# Altium schematic symbol library LTSpiceLibrary.SchLib: 776 symbols (part 2 of 3)
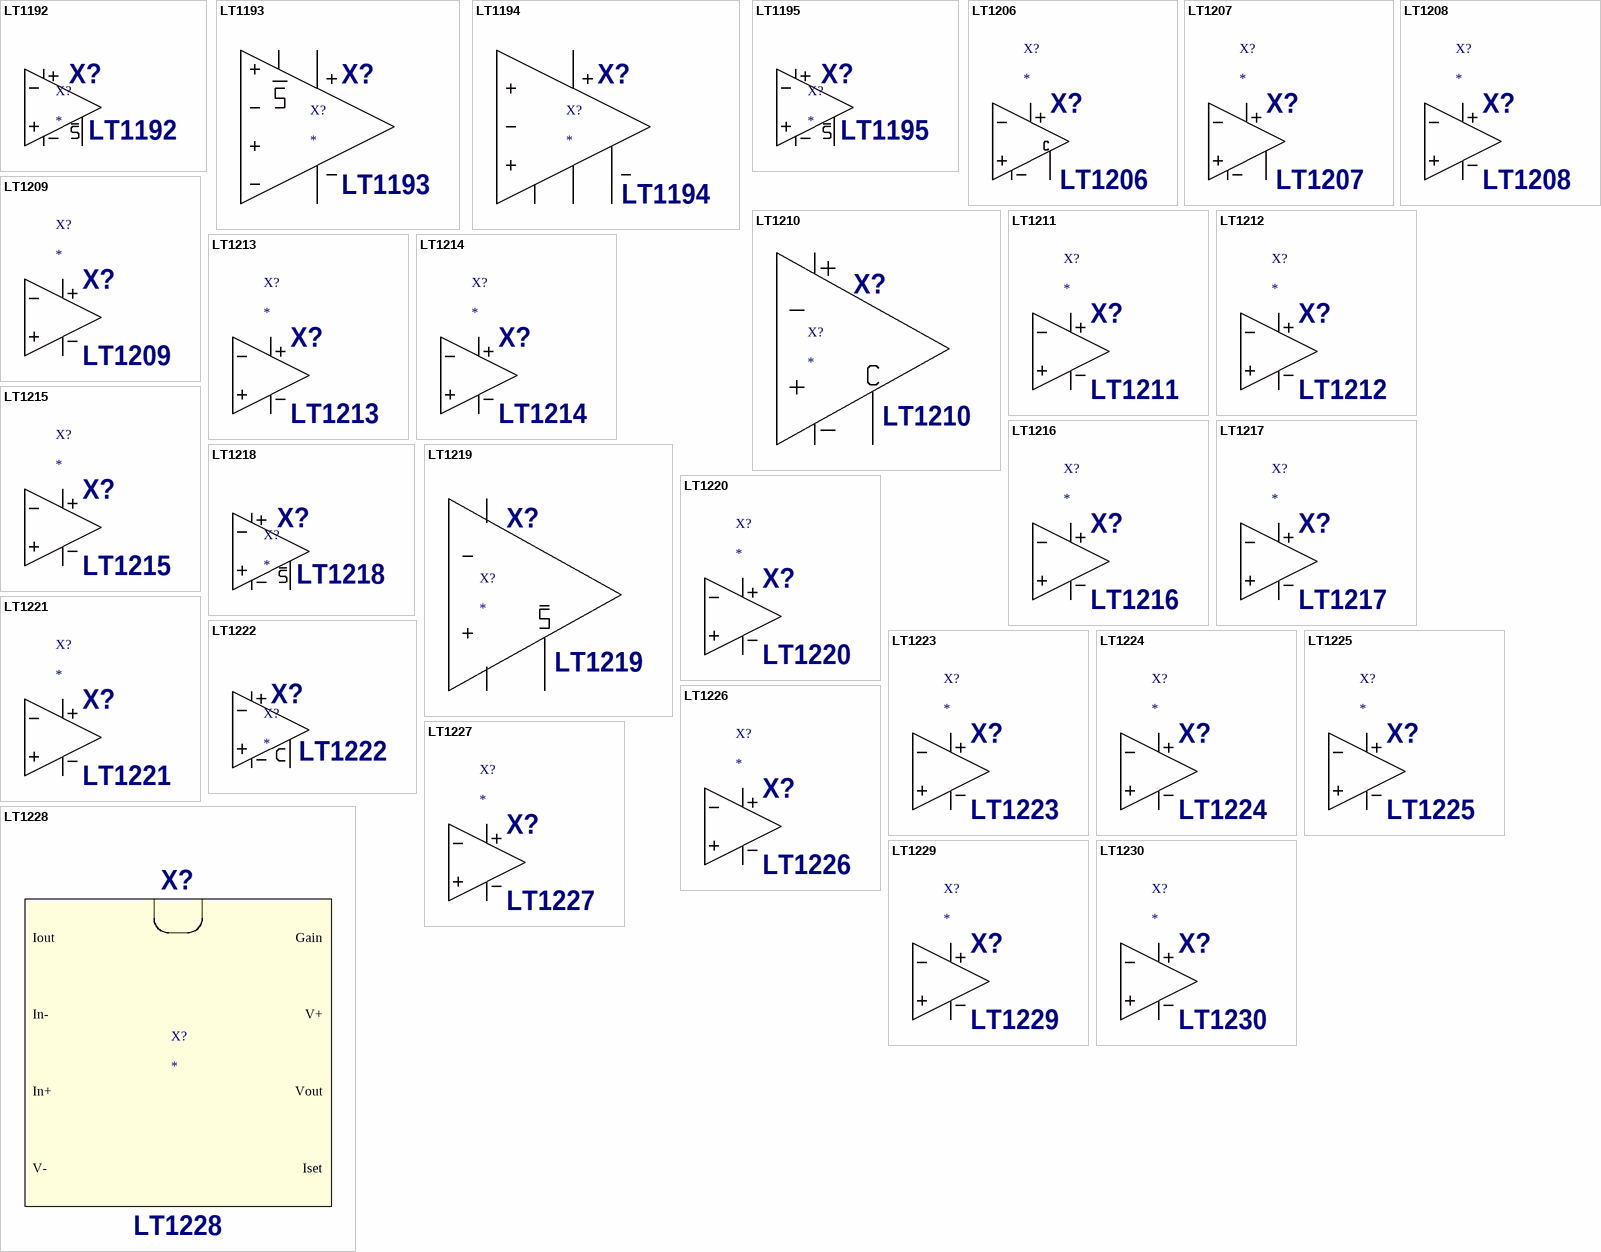
[diagram p29: symbols LT1192 to LT1230]

## LT1193
designator X?  value LT1193  InstName: X?
Prefix: X; Description: Video Difference Amplifier, Adjustable Gain; SpiceModel: LTC.lib; Value2: LT1193
pins: 1 In+, 2 In-, 3 V+, 4 V-, 5 OUT, 6 REF, 7 FB, 8 _SHDN

## LT1194
designator X?  value LT1194  InstName: X?
Prefix: X; Description: Video Difference Amplifier, Gain of 10; SpiceModel: LTC.lib; Value2: LT1194
pins: 1 In+, 2 In-, 3 V+, 4 V-, 5 OUT, 6 REF, 7 VOS1, 8 VOS2

## LT1195
designator X?  value LT1195  InstName: X?
Prefix: X; Description: Low Power, Ultra High Speed Operational Amplifier; SpiceModel: LTC.lib; Value2: LT1195
pins: 1 In+, 2 In-, 3 V+, 4 V-, 5 OUT, 6 SHDN

## LT1206
designator X?  value LT1206  InstName: X?
Prefix: X; Description: 250mA/60MHz Current Feedback Amplifier; SpiceModel: LTC.lib; Value2: LT1206
pins: 1 In+, 2 In-, 3 V+, 4 V-, 5 OUT, 6 COMP

## LT1207
designator X?  value LT1207  InstName: X?
Prefix: X; Value2: LT1206; Description: Dual 250mA/60MHz Current Feedback Amplifier; SpiceModel: LTC.lib
pins: 1 In+, 2 In-, 3 V+, 4 V-, 5 OUT, 6 COMP

## LT1208
designator X?  value LT1208  InstName: X?
Prefix: X; Description: Dual 45MHz, 400V/�s Operational Amplifier; SpiceModel: LTC.lib; Value2: LT1208
pins: 1 In+, 2 In-, 3 V+, 4 V-, 5 OUT

## LT1209
designator X?  value LT1209  InstName: X?
Prefix: X; Value2: LT1208; Description: Quad 45MHz, 400V/�s Operational Amplifier; SpiceModel: LTC.lib
pins: 1 In+, 2 In-, 3 V+, 4 V-, 5 OUT

## LT1210
designator X?  value LT1210  InstName: X?
Prefix: X; Description: 1.1A, 35MHz Current Feedback Amplifier; SpiceModel: LTC.lib; Value2: LT1210
pins: 1 In+, 2 In-, 3 V+, 4 V-, 5 OUT, 6 CMP

## LT1211
designator X?  value LT1211  InstName: X?
Prefix: X; Description: 14MHz, 7V/�s, Single Supply Dual Precision Operational Amplifier; SpiceModel: LTC.lib; Value2: LT1211
pins: 1 In+, 2 In-, 3 V+, 4 V-, 5 OUT

## LT1212
designator X?  value LT1212  InstName: X?
Prefix: X; Value2: LT1211; Description: 14MHz, 7V/�s, Single Supply Quad Precision Operational Amplifier; SpiceModel: LTC.lib
pins: 1 In+, 2 In-, 3 V+, 4 V-, 5 OUT

## LT1213
designator X?  value LT1213  InstName: X?
Prefix: X; Description: 28MHz, 12V/�s, Single Supply Dual Precision Operational Amplifier; SpiceModel: LTC.lib; Value2: LT1213
pins: 1 In+, 2 In-, 3 V+, 4 V-, 5 OUT

## LT1214
designator X?  value LT1214  InstName: X?
Prefix: X; Value2: LT1213; Description: 28MHz, 12V/�s, Single Supply Quad Precision Operational Amplifier; SpiceModel: LTC.lib
pins: 1 In+, 2 In-, 3 V+, 4 V-, 5 OUT

## LT1215
designator X?  value LT1215  InstName: X?
Prefix: X; Description: 23MHz, 50V/�s, Single Supply Dual Precision Operational Amplifier; SpiceModel: LTC.lib; Value2: LT1215
pins: 1 In+, 2 In-, 3 V+, 4 V-, 5 OUT

## LT1216
designator X?  value LT1216  InstName: X?
Prefix: X; Value2: LT1215; Description: 23MHz, 50V/�s, Single Supply Quad Precision Operational Amplifier; SpiceModel: LTC.lib
pins: 1 In+, 2 In-, 3 V+, 4 V-, 5 OUT

## LT1217
designator X?  value LT1217  InstName: X?
Prefix: X; Description: Low Power High Speed Current Feedback Amplifier; SpiceModel: LTC.lib; Value2: LT1217
pins: 1 In+, 2 In-, 3 V+, 4 V-, 5 OUT

## LT1218
designator X?  value LT1218  InstName: X?
Prefix: X; Description: Precision Rail-to-Rail Input and Output Op Amp; SpiceModel: LTC.lib; Value2: LT1218
pins: 1 In+, 2 In-, 3 V+, 4 V-, 5 OUT, 6 SHDN

## LT1219
designator X?  value LT1219  InstName: X?
Prefix: X; Description: Precision Rail-to-Rail Input and Output Operational Amplifier; SpiceModel: LTC.lib; Value2: LT1219
pins: 1 In+, 2 In-, 3 V+, 4 V-, 5 OUT, 6 SHDN

## LT1220
designator X?  value LT1220  InstName: X?
Prefix: X; Description: Very High Speed Operational Amplifier(Av >= 1); SpiceModel: LTC.lib; Value2: LT1220
pins: 1 In+, 2 In-, 3 V+, 4 V-, 5 OUT

## LT1221
designator X?  value LT1221  InstName: X?
Prefix: X; Description: Very High Speed Operational Amplifier(Av >= 4); SpiceModel: LTC.lib; Value2: LT1221
pins: 1 In+, 2 In-, 3 V+, 4 V-, 5 OUT

## LT1222
designator X?  value LT1222  InstName: X?
Prefix: X; Description: Low Noise, Very High Speed Operational Amplifier(Av >= 10); SpiceModel: LTC.lib; Value2: LT1222
pins: 1 In+, 2 In-, 3 V+, 4 V-, 5 OUT, 6 Comp

## LT1223
designator X?  value LT1223  InstName: X?
Prefix: X; Description: 100MHz Current Feedback Amplifier; SpiceModel: LTC.lib; Value2: LT1223
pins: 1 In+, 2 In-, 3 V+, 4 V-, 5 OUT

## LT1224
designator X?  value LT1224  InstName: X?
Prefix: X; Description: Very High Speed Operational Amplifier(Av >= 1); SpiceModel: LTC.lib; Value2: LT1224
pins: 1 In+, 2 In-, 3 V+, 4 V-, 5 OUT

## LT1225
designator X?  value LT1225  InstName: X?
Prefix: X; Description: Very High Speed Operational Amplifier(Av >= 5); SpiceModel: LTC.lib; Value2: LT1225
pins: 1 In+, 2 In-, 3 V+, 4 V-, 5 OUT

## LT1226
designator X?  value LT1226  InstName: X?
Prefix: X; Description: Very High Speed Operational Amplifier(Av >= 25); SpiceModel: LTC.lib; Value2: LT1226
pins: 1 In+, 2 In-, 3 V+, 4 V-, 5 OUT

## LT1227
designator X?  value LT1227  InstName: X?
Prefix: X; Description: 140MHz Video Current Feedback Amplifier; SpiceModel: LTC.lib; Value2: LT1227
pins: 1 In+, 2 In-, 3 V+, 4 V-, 5 OUT

## LT1228
designator X?  value LT1228  InstName: X?
Prefix: X; Description: 100MHz Current Feedback Amplifier with DC Gain Control; SpiceModel: LTC.lib; Value2: LT1228
pins: 1 Iout, 2 In-, 3 In+, 4 V-, 5 Iset, 6 Vout, 7 V+, 8 Gain

## LT1229
designator X?  value LT1229  InstName: X?
Prefix: X; Description: Dual 100MHz Current Feedback Amplifier; SpiceModel: LTC.lib; Value2: LT1229
pins: 1 In+, 2 In-, 3 V+, 4 V-, 5 OUT

## LT1230
designator X?  value LT1230  InstName: X?
Prefix: X; Value2: LT1229; Description: Quad 100MHz Current Feedback Amplifier; SpiceModel: LTC.lib
pins: 1 In+, 2 In-, 3 V+, 4 V-, 5 OUT

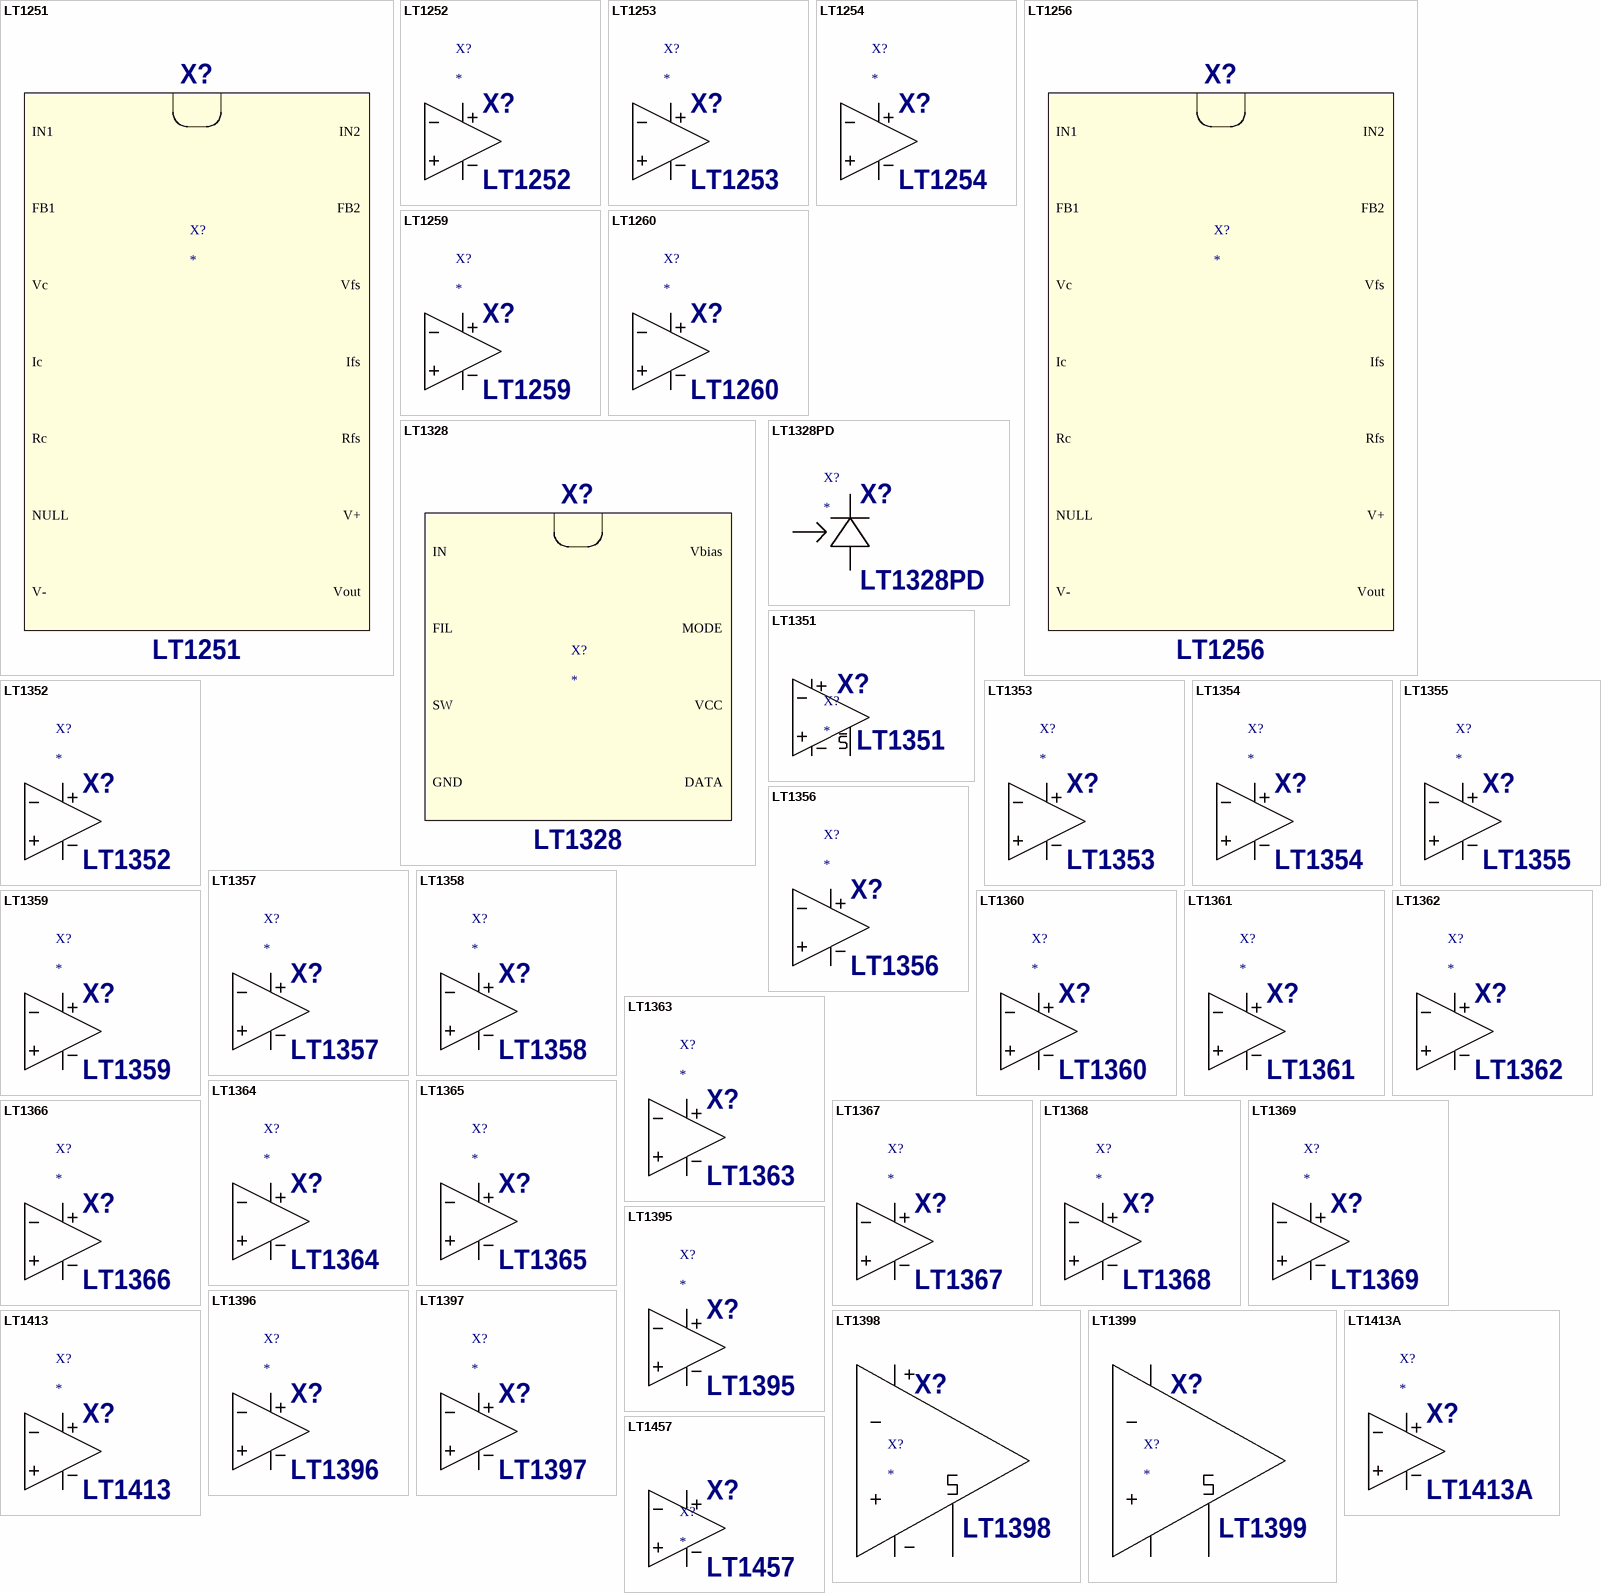
[diagram p9: symbols LT1251 to LT1457]

## LT1251
designator X?  value LT1251  InstName: X?
Prefix: X; Description: 40MHz Video Fader and DC Gain Controlled Amplifier; SpiceModel: LTC.lib; Value2: LT1251
pins: 1 IN1, 2 FB1, 3 Vc, 4 Ic, 5 Rc, 6 NULL, 7 V-, 8 Vout, 9 V+, 10 Rfs, 11 Ifs, 12 Vfs, 13 FB2, 14 IN2

## LT1252
designator X?  value LT1252  InstName: X?
Prefix: X; Description: Low Cost Video Amplifier; SpiceModel: LTC.lib; Value2: LT1252
pins: 1 In+, 2 In-, 3 V+, 4 V-, 5 OUT

## LT1253
designator X?  value LT1253  InstName: X?
Prefix: X; Description: Dual Low Cost Video Amplifier; SpiceModel: LTC.lib; Value2: LT1253
pins: 1 In+, 2 In-, 3 V+, 4 V-, 5 OUT

## LT1254
designator X?  value LT1254  InstName: X?
Prefix: X; Description: Quad Low Cost Video Amplifier; SpiceModel: LTC.lib; Value2: LT1254
pins: 1 In+, 2 In-, 3 V+, 4 V-, 5 OUT

## LT1256
designator X?  value LT1256  InstName: X?
Prefix: X; Description: 40MHz Video Fader and DC Gain Controlled Amplifier; SpiceModel: LTC.lib; Value2: LT1256
pins: 1 IN1, 2 FB1, 3 Vc, 4 Ic, 5 Rc, 6 NULL, 7 V-, 8 Vout, 9 V+, 10 Rfs, 11 Ifs, 12 Vfs, 13 FB2, 14 IN2

## LT1259
designator X?  value LT1259  InstName: X?
Prefix: X; Description: Low Cost Dual 130MHz Current Feedback Amplifier with Shutdown; SpiceModel: LTC.lib; Value2: LT1259
pins: 1 In+, 2 In-, 3 V+, 4 V-, 5 OUT

## LT1260
designator X?  value LT1260  InstName: X?
Prefix: X; Value2: LT1259; Description: Low Cost Triple 130MHz Current Feedback Amplifier with Shutdown; SpiceModel: LTC.lib
pins: 1 In+, 2 In-, 3 V+, 4 V-, 5 OUT

## LT1328
designator X?  value LT1328  InstName: X?
Prefix: X; Description: 4Mbps IrDA Infrared Receiver -- simulate with LT1328PD, the IR diode; SpiceModel: LTC.lib; Value2: LT1328
pins: 1 IN, 2 FIL, 3 SW, 4 GND, 5 DATA, 6 VCC, 7 MODE, 8 Vbias

## LT1328PD
designator X?  value LT1328PD  InstName: X?
Prefix: X; Description: A photodiode similar to a SFH-205 for testing the LT1328, drive the light input with a current source; SpiceModel: LTC.lib; Value2: LT1328PD
pins: 1 A, 2 C, 3 L

## LT1351
designator X?  value LT1351  InstName: X?
Prefix: X; Description: 250�A, 3MHz, 200V/�s, Operational Amplifier; SpiceModel: LTC.lib; Value2: LT1351
pins: 1 In+, 2 In-, 3 V+, 4 V-, 5 OUT, 6 SHDN

## LT1352
designator X?  value LT1352  InstName: X?
Prefix: X; Description: Dual 250mA, 3MHz, 200V/�s, Operational Amplifier; SpiceModel: LTC.lib; Value2: LT1352
pins: 1 In+, 2 In-, 3 V+, 4 V-, 5 OUT

## LT1353
designator X?  value LT1353  InstName: X?
Prefix: X; Value2: LT1352; Description: Quad 250mA, 3MHz, 200V/�s, Operational Amplifier; SpiceModel: LTC.lib
pins: 1 In+, 2 In-, 3 V+, 4 V-, 5 OUT

## LT1354
designator X?  value LT1354  InstName: X?
Prefix: X; Description: 12MHz, 400V/�s, Operational Amplifier; SpiceModel: LTC.lib; Value2: LT1354
pins: 1 In+, 2 In-, 3 V+, 4 V-, 5 OUT

## LT1355
designator X?  value LT1355  InstName: X?
Prefix: X; Value2: LT1354; Description: Dual 12MHz, 400V/�s, Operational Amplifier; SpiceModel: LTC.lib
pins: 1 In+, 2 In-, 3 V+, 4 V-, 5 OUT

## LT1356
designator X?  value LT1356  InstName: X?
Prefix: X; Value2: LT1354; Description: Quad 12MHz, 400V/�s, Operational Amplifier; SpiceModel: LTC.lib
pins: 1 In+, 2 In-, 3 V+, 4 V-, 5 OUT

## LT1357
designator X?  value LT1357  InstName: X?
Prefix: X; Description: 25MHz, 600V/�s, Operational Amplifier; SpiceModel: LTC.lib; Value2: LT1357
pins: 1 In+, 2 In-, 3 V+, 4 V-, 5 OUT

## LT1358
designator X?  value LT1358  InstName: X?
Prefix: X; Value2: LT1357; Description: Dual 25MHz, 600V/�s, Operational Amplifier; SpiceModel: LTC.lib
pins: 1 In+, 2 In-, 3 V+, 4 V-, 5 OUT

## LT1359
designator X?  value LT1359  InstName: X?
Prefix: X; Value2: LT1357; Description: Quad 25MHz, 600V/�s, Operational Amplifier; SpiceModel: LTC.lib
pins: 1 In+, 2 In-, 3 V+, 4 V-, 5 OUT

## LT1360
designator X?  value LT1360  InstName: X?
Prefix: X; Description: 50MHz, 800V/�s, Operational Amplifier; SpiceModel: LTC.lib; Value2: LT1360
pins: 1 In+, 2 In-, 3 V+, 4 V-, 5 OUT

## LT1361
designator X?  value LT1361  InstName: X?
Prefix: X; Value2: LT1360; Description: Dual 50MHz, 800V/�s, Operational Amplifier; SpiceModel: LTC.lib
pins: 1 In+, 2 In-, 3 V+, 4 V-, 5 OUT

## LT1362
designator X?  value LT1362  InstName: X?
Prefix: X; Value2: LT1360; Description: Quad 50MHz, 800V/�s, Operational Amplifier; SpiceModel: LTC.lib
pins: 1 In+, 2 In-, 3 V+, 4 V-, 5 OUT

## LT1363
designator X?  value LT1363  InstName: X?
Prefix: X; Description: 70MHz, 1000V/�s, Operational Amplifier; SpiceModel: LTC.lib; Value2: LT1363
pins: 1 In+, 2 In-, 3 V+, 4 V-, 5 OUT

## LT1364
designator X?  value LT1364  InstName: X?
Prefix: X; Value2: LT1363; Description: Dual 70MHz, 1000V/�s, Operational Amplifier; SpiceModel: LTC.lib
pins: 1 In+, 2 In-, 3 V+, 4 V-, 5 OUT

## LT1365
designator X?  value LT1365  InstName: X?
Prefix: X; Value2: LT1363; Description: Quad 70MHz, 1000V/�s, Operational Amplifier; SpiceModel: LTC.lib
pins: 1 In+, 2 In-, 3 V+, 4 V-, 5 OUT

## LT1366
designator X?  value LT1366  InstName: X?
Prefix: X; Description: Dual Precision Rail-to-Rail Input and Output Operational Amplifier; SpiceModel: LTC.lib; Value2: LT1366
pins: 1 In+, 2 In-, 3 V+, 4 V-, 5 OUT

## LT1367
designator X?  value LT1367  InstName: X?
Prefix: X; Value2: LT1366; Description: Quad Precision Rail-to-Rail Input and Output Operational Amplifier; SpiceModel: LTC.lib
pins: 1 In+, 2 In-, 3 V+, 4 V-, 5 OUT

## LT1368
designator X?  value LT1368  InstName: X?
Prefix: X; Description: Dual Precision Rail-to-Rail Input and Output Operational Amplifier; SpiceModel: LTC.lib; Value2: LT1368
pins: 1 In+, 2 In-, 3 V+, 4 V-, 5 OUT

## LT1369
designator X?  value LT1369  InstName: X?
Prefix: X; Value2: LT1368; Description: Quad Precision Rail-to-Rail Input and Output Operational Amplifier; SpiceModel: LTC.lib
pins: 1 In+, 2 In-, 3 V+, 4 V-, 5 OUT

## LT1395
designator X?  value LT1395  InstName: X?
Prefix: X; Description: 400MHz Current Feedback Amplifier; SpiceModel: LTC.lib; Value2: LT1395
pins: 1 In+, 2 In-, 3 V+, 4 V-, 5 OUT

## LT1396
designator X?  value LT1396  InstName: X?
Prefix: X; Value2: LT1395; Description: Dual 400MHz Current Feedback Amplifier; SpiceModel: LTC.lib
pins: 1 In+, 2 In-, 3 V+, 4 V-, 5 OUT

## LT1397
designator X?  value LT1397  InstName: X?
Prefix: X; Value2: LT1395; Description: Quad 400MHz Current Feedback Amplifier; SpiceModel: LTC.lib
pins: 1 In+, 2 In-, 3 V+, 4 V-, 5 OUT

## LT1398
designator X?  value LT1398  InstName: X?
Prefix: X; Description: Dual Low Cost 300MHz Current Feedback Amplifier with Shutdown; SpiceModel: LTC.lib; Value2: LT1398
pins: 1 In+, 2 In-, 3 V+, 4 V-, 5 OUT, 6 SHDN

## LT1399
designator X?  value LT1399  InstName: X?
Prefix: X; Value2: LT1398; Description: Triple Low Cost 300MHz Current Feedback Amplifier with Shutdown; SpiceModel: LTC.lib
pins: 1 In+, 2 In-, 3 V+, 4 V-, 5 OUT, 6 SHDN

## LT1413
designator X?  value LT1413  InstName: X?
Prefix: X; Description: Single Supply, Dual Precision Operational Amplifier; SpiceModel: LTC.lib; Value2: LT1413
pins: 1 In+, 2 In-, 3 V+, 4 V-, 5 OUT

## LT1413A
designator X?  value LT1413A  InstName: X?
Prefix: X; Value2: LT1413; Description: Single Supply, Dual Precision Operational Amplifier; SpiceModel: LTC.lib
pins: 1 In+, 2 In-, 3 V+, 4 V-, 5 OUT

## LT1457
designator X?  value LT1457  InstName: X?
Prefix: X; Description: Dual Precision JFET Op Amp; SpiceModel: LTC2.LIB; Value2: LT1457
pins: 1 IN+, 2 IN-, 3 OUT, 4 VCC, 5 VEE

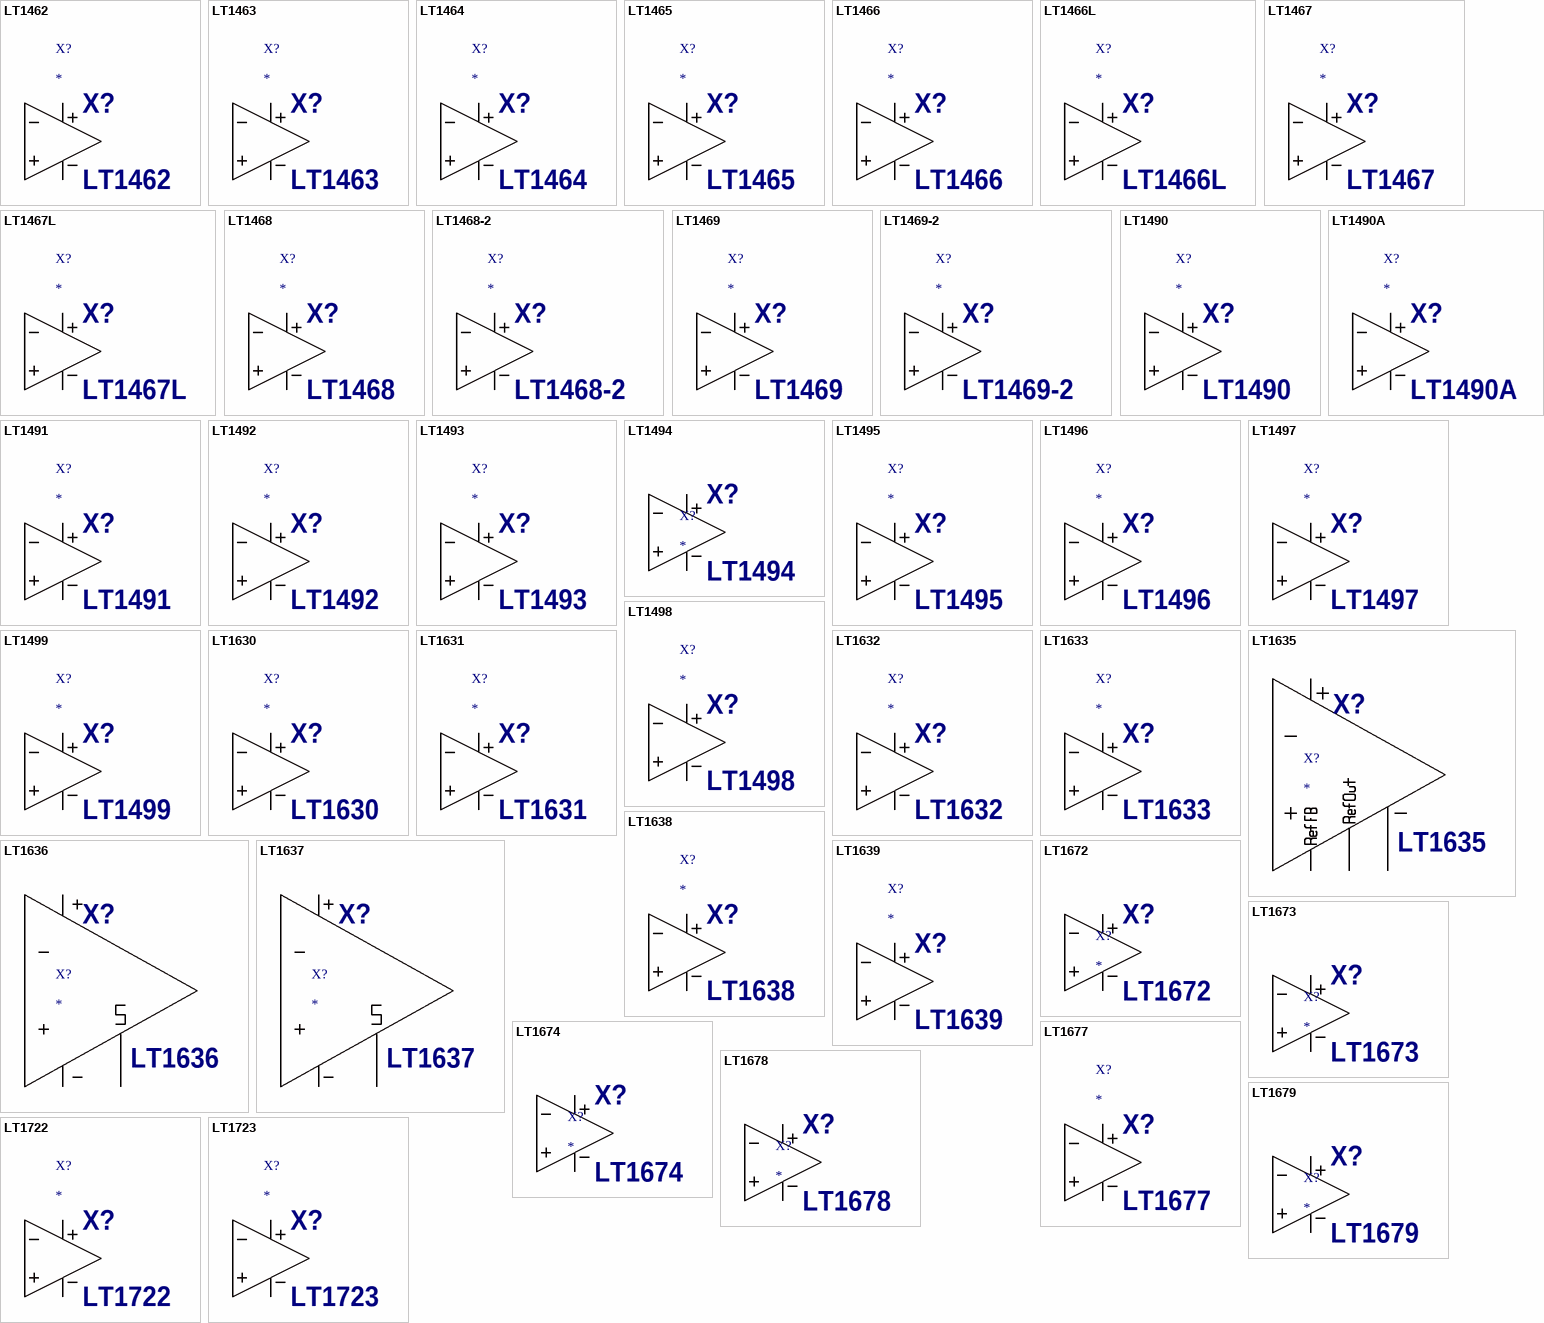
[diagram p10: symbols LT1462 to LT1723]

## LT1462
designator X?  value LT1462  InstName: X?
Prefix: X; Description: Dual �Power, 260�W C-Load Picoampere Bias Current JFET Input Operational Amplifier; SpiceModel: LTC.lib; Value2: LT1462
pins: 1 In+, 2 In-, 3 V+, 4 V-, 5 OUT

## LT1463
designator X?  value LT1463  InstName: X?
Prefix: X; Value2: LT1462; Description: Quad �Power, 260�W C-Load Picoampere Bias Current JFET Input Operational Amplifier; SpiceModel: LTC.lib
pins: 1 In+, 2 In-, 3 V+, 4 V-, 5 OUT

## LT1464
designator X?  value LT1464  InstName: X?
Prefix: X; Description: Dual �Power, 1MHz C-Load Picoampere Bias Current JFET Input Operational Amplifier; SpiceModel: LTC.lib; Value2: LT1464
pins: 1 In+, 2 In-, 3 V+, 4 V-, 5 OUT

## LT1465
designator X?  value LT1465  InstName: X?
Prefix: X; Value2: LT1464; Description: Quad �Power, 1MHz C-Load Picoampere Bias Current JFET Input Operational Amplifier; SpiceModel: LTC.lib
pins: 1 In+, 2 In-, 3 V+, 4 V-, 5 OUT

## LT1466
designator X?  value LT1466  InstName: X?
Prefix: X; Description: Dual �Power, Precision Rail-to-Rail Input and Output Operational Amplifier; SpiceModel: LTC.lib; Value2: LT1466
pins: 1 In+, 2 In-, 3 V+, 4 V-, 5 OUT

## LT1466L
designator X?  value LT1466L  InstName: X?
Prefix: X; Value2: LT1466; Description: Dual �Power, Precision Rail-to-Rail Input and Output Operational Amplifier; SpiceModel: LTC.lib
pins: 1 In+, 2 In-, 3 V+, 4 V-, 5 OUT

## LT1467
designator X?  value LT1467  InstName: X?
Prefix: X; Value2: LT1466; Description: Quad �Power, Precision Rail-to-Rail Input and Output Operational Amplifier; SpiceModel: LTC.lib
pins: 1 In+, 2 In-, 3 V+, 4 V-, 5 OUT

## LT1467L
designator X?  value LT1467L  InstName: X?
Prefix: X; Value2: LT1466; Description: Quad �Power, Precision Rail-to-Rail Input and Output Operational Amplifier; SpiceModel: LTC.lib
pins: 1 In+, 2 In-, 3 V+, 4 V-, 5 OUT

## LT1468
designator X?  value LT1468  InstName: X?
Prefix: X; Description: 90MHz, 22V/�s, 16-Bit Accurate Operational Amplifier; SpiceModel: LTC.lib; Value2: LT1468
pins: 1 In+, 2 In-, 3 V+, 4 V-, 5 OUT

## LT1468-2
designator X?  value LT1468-2  InstName: X?
Prefix: X; Description: 200MHz, 22V/�s, 16-Bit Accurate Operational Amplifier; SpiceModel: LTC4.lib; Value2: LT1468-2
pins: 1 In+, 2 In-, 3 V+, 4 V-, 5 OUT

## LT1469
designator X?  value LT1469  InstName: X?
Prefix: X; Value2: LT1468; Description: Dual 90MHz, 22V/�s, 16-Bit Accurate Operational Amplifier; SpiceModel: LTC.lib
pins: 1 In+, 2 In-, 3 V+, 4 V-, 5 OUT

## LT1469-2
designator X?  value LT1469-2  InstName: X?
Prefix: X; Value2: LT1468-2; Description: Dual 90MHz, 22V/�s, 16-Bit Accurate Operational Amplifier; SpiceModel: LTC4.lib
pins: 1 In+, 2 In-, 3 V+, 4 V-, 5 OUT

## LT1490
designator X?  value LT1490  InstName: X?
Prefix: X; Value2: LT1490A; Description: Dual �Power Precision Rail-to-Rail Input and Output Operational Amplifier; SpiceModel: LTC.lib
pins: 1 In+, 2 In-, 3 V+, 4 V-, 5 OUT

## LT1490A
designator X?  value LT1490A  InstName: X?
Prefix: X; Description: Dual �Power Precision Rail-to-Rail Input and Output Operational Amplifier; SpiceModel: LTC.lib; Value2: LT1490A
pins: 1 In+, 2 In-, 3 V+, 4 V-, 5 OUT

## LT1491
designator X?  value LT1491  InstName: X?
Prefix: X; Value2: LT1490A; Description: Quad �Power Precision Rail-to-Rail Input and Output Operational Amplifier; SpiceModel: LTC.lib
pins: 1 In+, 2 In-, 3 V+, 4 V-, 5 OUT

## LT1492
designator X?  value LT1492  InstName: X?
Prefix: X; Description: Dual 5MHz, 3V/�s Low Power Single Supply Precision Operational Amplifier; SpiceModel: LTC.lib; Value2: LT1492
pins: 1 In+, 2 In-, 3 V+, 4 V-, 5 OUT

## LT1493
designator X?  value LT1493  InstName: X?
Prefix: X; Value2: LT1492; Description: Quad 5MHz, 3V/�s Low Power Single Supply Precision Operational Amplifier; SpiceModel: LTC.lib
pins: 1 In+, 2 In-, 3 V+, 4 V-, 5 OUT

## LT1494
designator X?  value LT1494  InstName: X?
Prefix: X; Description: 1.5�A Max Over-the-Top Precision Rail-to-Rail Input and Output Opamp; SpiceModel: LTC.lib; Value2: LT1494
pins: 1 In+, 2 In-, 3 V+, 4 V-, 5 OUT

## LT1495
designator X?  value LT1495  InstName: X?
Prefix: X; Value2: LT1494; Description: Dual 1.5�A Max Over-the-Top Precision Rail-to-Rail Input and Output Opamp(1 of 2); SpiceModel: LTC.lib
pins: 1 In+, 2 In-, 3 V+, 4 V-, 5 OUT

## LT1496
designator X?  value LT1496  InstName: X?
Prefix: X; Value2: LT1494; Description: Quad 1.5�A Max, Precision Rail-to-Rail Input and Output Operational Amplifier(1 of 4); SpiceModel: LTC.lib
pins: 1 In+, 2 In-, 3 V+, 4 V-, 5 OUT

## LT1497
designator X?  value LT1497  InstName: X?
Prefix: X; Description: Dual 125mA, 50MHz, Current Feedback Amplifier; SpiceModel: LTC.lib; Value2: LT1497
pins: 1 In+, 2 In-, 3 V+, 4 V-, 5 OUT

## LT1498
designator X?  value LT1498  InstName: X?
Prefix: X; Description: Dual 10MHz, 6V/�s, Rail-to-Rail Input and Output Precision C-Load Operational Amplifier; SpiceModel: LTC.lib; Value2: LT1498
pins: 1 In+, 2 In-, 3 V+, 4 V-, 5 OUT

## LT1499
designator X?  value LT1499  InstName: X?
Prefix: X; Value2: LT1498; Description: Quad 10MHz, 6V/�s, Rail-to-Rail Input and Output Precision C-Load Operational Amplifier; SpiceModel: LTC.lib
pins: 1 In+, 2 In-, 3 V+, 4 V-, 5 OUT

## LT1630
designator X?  value LT1630  InstName: X?
Prefix: X; Description: Dual 30MHz, 10V/�s, Rail-to-Rail Input and Output Precision Operational Amplifier; SpiceModel: LTC.lib; Value2: LT1630
pins: 1 In+, 2 In-, 3 V+, 4 V-, 5 OUT

## LT1631
designator X?  value LT1631  InstName: X?
Prefix: X; Value2: LT1630; Description: Quad 30MHz, 10V/�s, Rail-to-Rail Input and Output Precision Operational Amplifier; SpiceModel: LTC.lib
pins: 1 In+, 2 In-, 3 V+, 4 V-, 5 OUT

## LT1632
designator X?  value LT1632  InstName: X?
Prefix: X; Description: Dual 45MHz, 45V/�s, Rail-to-Rail Input and Output Precision Operational Amplifier; SpiceModel: LTC.lib; Value2: LT1632
pins: 1 In+, 2 In-, 3 V+, 4 V-, 5 OUT

## LT1633
designator X?  value LT1633  InstName: X?
Prefix: X; Value2: LT1632; Description: Quad 45MHz, 45V/�s, Rail-to-Rail Input and Output Precision Operational Amplifier; SpiceModel: LTC.lib
pins: 1 In+, 2 In-, 3 V+, 4 V-, 5 OUT

## LT1635
designator X?  value LT1635  InstName: X?
Prefix: X; Description: �Power Rail-to-Rail Operational Amplifier and Reference; SpiceModel: LTC.lib; Value2: LT1635
pins: 1 In+, 2 In-, 3 V+, 4 V-, 5 OUT, 6 RefOut, 7 RefFB

## LT1636
designator X?  value LT1636  InstName: X?
Prefix: X; Description: Over-The-Top �Power Rail-to-Rail Input and Output Operational Amplifier with Shutdown; SpiceModel: LTC.lib; Value2: LT1636
pins: 1 In+, 2 In-, 3 V+, 4 V-, 5 OUT, 6 SHDN

## LT1637
designator X?  value LT1637  InstName: X?
Prefix: X; Description: 1.1MHz, 0.4V/�s Over-The-Top �Power Rail-to-Rail Input and Output Operational Amplifier; SpiceModel: LTC.lib; Value2: LT1637
pins: 1 In+, 2 In-, 3 V+, 4 V-, 5 OUT, 6 SHDN

## LT1638
designator X?  value LT1638  InstName: X?
Prefix: X; Description: Dual 1.2MHz, 0.4V/�s, Over-The-Top �Power Rail-to-Rail input and output Operational Amplifier; SpiceModel: LTC.lib; Value2: LT1638
pins: 1 In+, 2 In-, 3 V+, 4 V-, 5 OUT

## LT1639
designator X?  value LT1639  InstName: X?
Prefix: X; Value2: LT1638; Description: Dual 1.2MHz, 0.4V/�s, Over-The-Top �Power Rail-to-Rail input and output Operational Amplifier; SpiceModel: LTC.lib
pins: 1 In+, 2 In-, 3 V+, 4 V-, 5 OUT

## LT1672
designator X?  value LT1672  InstName: X?
Prefix: X; Description: Single 2 �A, Av > 5 Over-The-Top Precision Rail-to-Rail Op Amp; SpiceModel: LTC2.LIB; Value2: LT1672
pins: 1 IN+, 2 IN-, 3 OUT, 4 VCC, 5 VEE

## LT1673
designator X?  value LT1673  InstName: X?
Prefix: X; Value2: LT1672; Description: Dual 2 �A, Av > 5 Over-The-Top Precision Rail-to-Rail Op Amp; SpiceModel: LTC2.LIB
pins: 1 IN+, 2 IN-, 3 OUT, 4 VCC, 5 VEE

## LT1674
designator X?  value LT1674  InstName: X?
Prefix: X; Value2: LT1672; Description: Quad 2 �A, Av > 5 Over-The-Top Precision Rail-to-Rail Op Amp; SpiceModel: LTC2.LIB
pins: 1 IN+, 2 IN-, 3 OUT, 4 VCC, 5 VEE

## LT1677
designator X?  value LT1677  InstName: X?
Prefix: X; Description: Low Noise, Rail-to-Rail Input and Output Precision Operational Amplifier; SpiceModel: LTC.lib; Value2: LT1677
pins: 1 In+, 2 In-, 3 V+, 4 V-, 5 OUT

## LT1678
designator X?  value LT1678  InstName: X?
Prefix: X; Description: Low Noise, Rail-to-Rail, Precision Op Amp; SpiceModel: LTC2.LIB; Value2: LT1678
pins: 1 IN+, 2 IN-, 3 OUT, 4 VCC, 5 VEE

## LT1679
designator X?  value LT1679  InstName: X?
Prefix: X; Value2: LT1678; Description: Low Noise, Rail-to-Rail, Precision Op Amp; SpiceModel: LTC2.LIB
pins: 1 IN+, 2 IN-, 3 OUT, 4 VCC, 5 VEE

## LT1722
designator X?  value LT1722  InstName: X?
Prefix: X; Description: 200MHz Low Noise Precision Operational Amplifier; SpiceModel: LTC.lib; Value2: LT1722
pins: 1 In+, 2 In-, 3 V+, 4 V-, 5 OUT

## LT1723
designator X?  value LT1723  InstName: X?
Prefix: X; Value2: LT1722; Description: Dual 200MHz Low Noise Precision Operational Amplifier; SpiceModel: LTC.lib
pins: 1 In+, 2 In-, 3 V+, 4 V-, 5 OUT
